# Altium footprint library ref-packages.PCBLIB: 1543 footprints (part 65 of 103)
Each footprint in its own frame and in the unit in brackets; x right, y up, seen from the top. Pads: shape width x height; smd on the part's side, far side on the other; paste and mask are expansions set on the pad; w line width, h text height; cw(c..) or ccw(c..) is an arc to the next point about the centre after c.
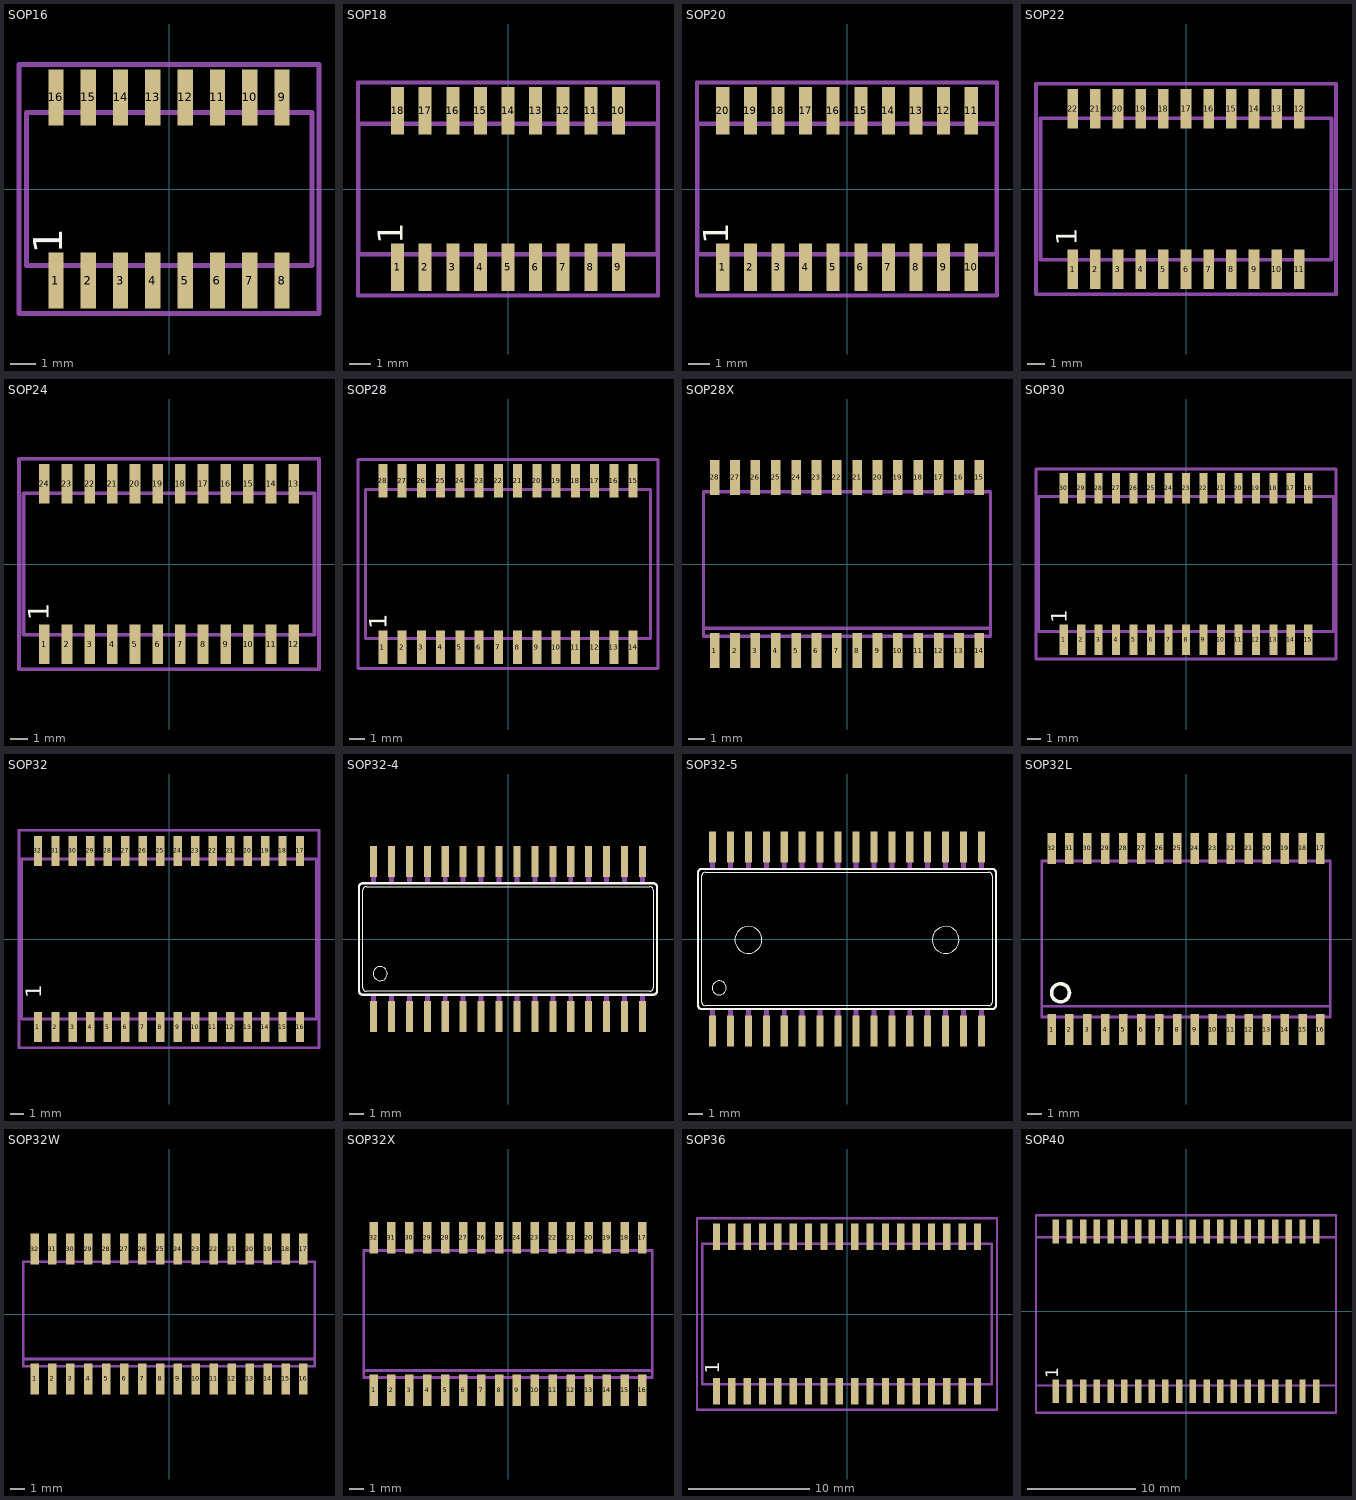
[diagram p64: the footprints below, top view; thin cyan lines are the x and y axes]

## SOP16 [mil]
pads (16):
  rect 23.62x86.61 smd: 1(-175,-141.73) 2(-125,-141.73) 3(-75,-141.73) 4(-25,-141.73) 5(25,-141.73) 6(75,-141.73) 7(125,-141.73) 8(175,-141.73) 9(175,141.73) 10(125,141.73) 11(75,141.73) 12(25,141.73) 13(-25,141.73) 14(-75,141.73) 15(-125,141.73) 16(-175,141.73)
Top Overlay:
  text "1" at -150,-100 h77.5
Mechanical 16:
  rectangle: -184.84,-174.8 -165.16,-122.44
  rectangle: -134.84,-174.8 -115.16,-122.44
  rectangle: -84.84,-174.8 -65.16,-122.44
  rectangle: -34.84,-174.8 -15.16,-122.44
  rectangle: 15.16,-174.8 34.84,-122.44
  rectangle: 65.16,-174.8 84.84,-122.44
  rectangle: 115.16,-174.8 134.84,-122.44
  rectangle: 165.16,-174.8 184.84,-122.44
  rectangle: 165.16,122.44 184.84,174.8
  rectangle: 115.16,122.44 134.84,174.8
  rectangle: 65.16,122.44 84.84,174.8
  rectangle: 15.16,122.44 34.84,174.8
  rectangle: -34.84,122.44 -15.16,174.8
  rectangle: -84.84,122.44 -65.16,174.8
  rectangle: -134.84,122.44 -115.16,174.8
  rectangle: -184.84,122.44 -165.16,174.8
  lines w8: -220.67,-118.5 -220.67,118.5 221.46,118.5 221.46,-118.5 -220.67,-118.5
Mechanical 27:
  lines w7.87: -232.28,-192.91 -232.28,192.91 232.28,192.91 232.28,-192.91 -232.28,-192.91

## SOP18 [mil]
pads (18):
  rect 23.62x86.61 smd: 1(-200,-141.73) 2(-150,-141.73) 3(-100,-141.73) 4(-50,-141.73) 5(0,-141.73) 6(50,-141.73) 7(100,-141.73) 8(150,-141.73) 9(200,-141.73) 10(200,141.73) 11(150,141.73) 12(100,141.73) 13(50,141.73) 14(0,141.73) 15(-50,141.73) 16(-100,141.73) 17(-150,141.73) 18(-200,141.73)
Top Overlay:
  text "1" at -175,-100 h77.5
Mechanical 16:
  rectangle: -209.84,-174.8 -190.16,-122.44
  rectangle: -159.84,-174.8 -140.16,-122.44
  rectangle: -109.84,-174.8 -90.16,-122.44
  rectangle: -59.84,-174.8 -40.16,-122.44
  rectangle: -9.84,-174.8 9.84,-122.44
  rectangle: 40.16,-174.8 59.84,-122.44
  rectangle: 90.16,-174.8 109.84,-122.44
  rectangle: 140.16,-174.8 159.84,-122.44
  rectangle: 190.16,-174.8 209.84,-122.44
  rectangle: 190.16,122.44 209.84,174.8
  rectangle: 140.16,122.44 159.84,174.8
  rectangle: 90.16,122.44 109.84,174.8
  rectangle: 40.16,122.44 59.84,174.8
  rectangle: -9.84,122.44 9.84,174.8
  rectangle: -59.84,122.44 -40.16,174.8
  rectangle: -109.84,122.44 -90.16,174.8
  rectangle: -159.84,122.44 -140.16,174.8
  rectangle: -209.84,122.44 -190.16,174.8
  lines w8: -270.87,-118.5 270.87,-118.5 270.87,118.5 -270.87,118.5 -270.87,-118.5
Mechanical 27:
  lines w7.87: -271.65,-192.91 -271.65,192.91 271.65,192.91 271.65,-192.91 -271.65,-192.91

## SOP20 [mil]
pads (20):
  rect 23.62x86.61 smd: 1(-225,-141.73) 2(-175,-141.73) 3(-125,-141.73) 4(-75,-141.73) 5(-25,-141.73) 6(25,-141.73) 7(75,-141.73) 8(125,-141.73) 9(175,-141.73) 10(225,-141.73) 11(225,141.73) 12(175,141.73) 13(125,141.73) 14(75,141.73) 15(25,141.73) 16(-25,141.73) 17(-75,141.73) 18(-125,141.73) 19(-175,141.73) 20(-225,141.73)
Top Overlay:
  text "1" at -200,-100 h77.5
Mechanical 16:
  rectangle: -234.84,-174.8 -215.16,-122.44
  rectangle: -184.84,-174.8 -165.16,-122.44
  rectangle: -134.84,-174.8 -115.16,-122.44
  rectangle: -84.84,-174.8 -65.16,-122.44
  rectangle: -34.84,-174.8 -15.16,-122.44
  rectangle: 15.16,-174.8 34.84,-122.44
  rectangle: 65.16,-174.8 84.84,-122.44
  rectangle: 115.16,-174.8 134.84,-122.44
  rectangle: 165.16,-174.8 184.84,-122.44
  rectangle: 215.16,-174.8 234.84,-122.44
  rectangle: 215.16,122.44 234.84,174.8
  rectangle: 165.16,122.44 184.84,174.8
  rectangle: 115.16,122.44 134.84,174.8
  rectangle: 65.16,122.44 84.84,174.8
  rectangle: 15.16,122.44 34.84,174.8
  rectangle: -34.84,122.44 -15.16,174.8
  rectangle: -84.84,122.44 -65.16,174.8
  rectangle: -134.84,122.44 -115.16,174.8
  rectangle: -184.84,122.44 -165.16,174.8
  rectangle: -234.84,122.44 -215.16,174.8
  lines w8: -270.87,-118.5 270.87,-118.5 270.87,118.5 -270.87,118.5 -270.87,-118.5
Mechanical 27:
  lines w7.87: -271.65,-192.91 -271.65,192.91 271.65,192.91 271.65,-192.91 -271.65,-192.91

## SOP22 [mil]
pads (22):
  rect 23.62x86.61 smd: 1(-250,-177.17) 2(-200,-177.17) 3(-150,-177.17) 4(-100,-177.17) 5(-50,-177.17) 6(0,-177.17) 7(50,-177.17) 8(100,-177.17) 9(150,-177.17) 10(200,-177.17) 11(250,-177.17) 12(250,177.17) 13(200,177.17) 14(150,177.17) 15(100,177.17) 16(50,177.17) 17(0,177.17) 18(-50,177.17) 19(-100,177.17) 20(-150,177.17) 21(-200,177.17) 22(-250,177.17)
Top Overlay:
  text "1" at -225,-125 h77.5
Mechanical 16:
  rectangle: -259.84,-212.2 -240.16,-159.84
  rectangle: -209.84,-212.2 -190.16,-159.84
  rectangle: -159.84,-212.2 -140.16,-159.84
  rectangle: -109.84,-212.2 -90.16,-159.84
  rectangle: -59.84,-212.2 -40.16,-159.84
  rectangle: -9.84,-212.2 9.84,-159.84
  rectangle: 40.16,-212.2 59.84,-159.84
  rectangle: 90.16,-212.2 109.84,-159.84
  rectangle: 140.16,-212.2 159.84,-159.84
  rectangle: 190.16,-212.2 209.84,-159.84
  rectangle: 240.16,-212.2 259.84,-159.84
  rectangle: 240.16,159.84 259.84,212.2
  rectangle: 190.16,159.84 209.84,212.2
  rectangle: 140.16,159.84 159.84,212.2
  rectangle: 90.16,159.84 109.84,212.2
  rectangle: 40.16,159.84 59.84,212.2
  rectangle: -9.84,159.84 9.84,212.2
  rectangle: -59.84,159.84 -40.16,212.2
  rectangle: -109.84,159.84 -90.16,212.2
  rectangle: -159.84,159.84 -140.16,212.2
  rectangle: -209.84,159.84 -190.16,212.2
  rectangle: -259.84,159.84 -240.16,212.2
  lines w8: -320.67,-155.91 320.67,-155.91 320.67,155.91 -320.67,155.91 -320.67,-155.91
Mechanical 27:
  lines w7.87: -330.71,-232.28 -330.71,232.28 330.71,232.28 330.71,-232.28 -330.71,-232.28

## SOP24 [mil]
pads (24):
  rect 23.62x86.61 smd: 1(-275,-177.17) 2(-225,-177.17) 3(-175,-177.17) 4(-125,-177.17) 5(-75,-177.17) 6(-25,-177.17) 7(25,-177.17) 8(75,-177.17) 9(125,-177.17) 10(175,-177.17) 11(225,-177.17) 12(275,-177.17) 13(275,177.17) 14(225,177.17) 15(175,177.17) 16(125,177.17) 17(75,177.17) 18(25,177.17) 19(-25,177.17) 20(-75,177.17) 21(-125,177.17) 22(-175,177.17) 23(-225,177.17) 24(-275,177.17)
Top Overlay:
  text "1" at -250,-125 h77.5
Mechanical 16:
  rectangle: -284.84,-212.2 -265.16,-159.84
  rectangle: -234.84,-212.2 -215.16,-159.84
  rectangle: -184.84,-212.2 -165.16,-159.84
  rectangle: -134.84,-212.2 -115.16,-159.84
  rectangle: -84.84,-212.2 -65.16,-159.84
  rectangle: -34.84,-212.2 -15.16,-159.84
  rectangle: 15.16,-212.2 34.84,-159.84
  rectangle: 65.16,-212.2 84.84,-159.84
  rectangle: 115.16,-212.2 134.84,-159.84
  rectangle: 165.16,-212.2 184.84,-159.84
  rectangle: 215.16,-212.2 234.84,-159.84
  rectangle: 265.16,-212.2 284.84,-159.84
  rectangle: 265.16,159.84 284.84,212.2
  rectangle: 215.16,159.84 234.84,212.2
  rectangle: 165.16,159.84 184.84,212.2
  rectangle: 115.16,159.84 134.84,212.2
  rectangle: 65.16,159.84 84.84,212.2
  rectangle: 15.16,159.84 34.84,212.2
  rectangle: -34.84,159.84 -15.16,212.2
  rectangle: -84.84,159.84 -65.16,212.2
  rectangle: -134.84,159.84 -115.16,212.2
  rectangle: -184.84,159.84 -165.16,212.2
  rectangle: -234.84,159.84 -215.16,212.2
  rectangle: -284.84,159.84 -265.16,212.2
  lines w8: -320.67,-155.91 320.67,-155.91 320.67,155.91 -320.67,155.91 -320.67,-155.91
Mechanical 27:
  lines w7.87: -330.71,-232.28 -330.71,232.28 330.71,232.28 330.71,-232.28 -330.71,-232.28

## SOP28 [mil]
pads (28):
  rect 23.62x86.61 smd: 1(-325,-216.54) 2(-275,-216.54) 3(-225,-216.54) 4(-175,-216.54) 5(-125,-216.54) 6(-75,-216.54) 7(-25,-216.54) 8(25,-216.54) 9(75,-216.54) 10(125,-216.54) 11(175,-216.54) 12(225,-216.54) 13(275,-216.54) 14(325,-216.54) 15(325,216.54) 16(275,216.54) 17(225,216.54) 18(175,216.54) 19(125,216.54) 20(75,216.54) 21(25,216.54) 22(-25,216.54) 23(-75,216.54) 24(-125,216.54) 25(-175,216.54) 26(-225,216.54) 27(-275,216.54) 28(-325,216.54)
Top Overlay:
  text "1" at -300,-169.69 h77.5
Mechanical 16:
  rectangle: -334.84,-249.61 -315.16,-197.24
  rectangle: -284.84,-249.61 -265.16,-197.24
  rectangle: -234.84,-249.61 -215.16,-197.24
  rectangle: -184.84,-249.61 -165.16,-197.24
  rectangle: -134.84,-249.61 -115.16,-197.24
  rectangle: -84.84,-249.61 -65.16,-197.24
  rectangle: -34.84,-249.61 -15.16,-197.24
  rectangle: 15.16,-249.61 34.84,-197.24
  rectangle: 65.16,-249.61 84.84,-197.24
  rectangle: 115.16,-249.61 134.84,-197.24
  rectangle: 165.16,-249.61 184.84,-197.24
  rectangle: 215.16,-249.61 234.84,-197.24
  rectangle: 265.16,-249.61 284.84,-197.24
  rectangle: 315.16,-249.61 334.84,-197.24
  rectangle: 315.16,197.24 334.84,249.61
  rectangle: 265.16,197.24 284.84,249.61
  rectangle: 215.16,197.24 234.84,249.61
  rectangle: 165.16,197.24 184.84,249.61
  rectangle: 115.16,197.24 134.84,249.61
  rectangle: 65.16,197.24 84.84,249.61
  rectangle: 15.16,197.24 34.84,249.61
  rectangle: -34.84,197.24 -15.16,249.61
  rectangle: -84.84,197.24 -65.16,249.61
  rectangle: -134.84,197.24 -115.16,249.61
  rectangle: -184.84,197.24 -165.16,249.61
  rectangle: -234.84,197.24 -215.16,249.61
  rectangle: -284.84,197.24 -265.16,249.61
  rectangle: -334.84,197.24 -315.16,249.61
  lines w8: -370.67,-193.31 370.67,-193.31 370.67,193.31 -370.67,193.31 -370.67,-193.31
Mechanical 27:
  lines w7.87: -389.76,-271.65 -389.76,271.65 389.76,271.65 389.76,-271.65 -389.76,-271.65

## SOP28X [mil]
pads (28):
  rect 23.62x86.61 smd: 1(-325,-212.6) 2(-275,-212.6) 3(-225,-212.6) 4(-175,-212.6) 5(-125,-212.6) 6(-75,-212.6) 7(-25,-212.6) 8(25,-212.6) 9(75,-212.6) 10(125,-212.6) 11(175,-212.6) 12(225,-212.6) 13(275,-212.6) 14(325,-212.6) 15(325,212.6) 16(275,212.6) 17(225,212.6) 18(175,212.6) 19(125,212.6) 20(75,212.6) 21(25,212.6) 22(-25,212.6) 23(-75,212.6) 24(-125,212.6) 25(-175,212.6) 26(-225,212.6) 27(-275,212.6) 28(-325,212.6)
Mechanical 16:
  rectangle: -334.65,-240.94 -315.35,-181.1
  rectangle: -284.65,-240.94 -265.35,-181.1
  rectangle: -234.65,-240.94 -215.35,-181.1
  rectangle: -184.65,-240.94 -165.35,-181.1
  rectangle: -134.65,-240.94 -115.35,-181.1
  rectangle: -84.65,-240.94 -65.35,-181.1
  rectangle: -34.65,-240.94 -15.35,-181.1
  rectangle: 15.35,-240.94 34.65,-181.1
  rectangle: 65.35,-240.94 84.65,-181.1
  rectangle: 115.35,-240.94 134.65,-181.1
  rectangle: 165.35,-240.94 184.65,-181.1
  rectangle: 215.35,-240.94 234.65,-181.1
  rectangle: 265.35,-240.94 284.65,-181.1
  rectangle: 315.35,-240.94 334.65,-181.1
  rectangle: 315.35,181.1 334.65,240.94
  rectangle: 265.35,181.1 284.65,240.94
  rectangle: 215.35,181.1 234.65,240.94
  rectangle: 165.35,181.1 184.65,240.94
  rectangle: 115.35,181.1 134.65,240.94
  rectangle: 65.35,181.1 84.65,240.94
  rectangle: 15.35,181.1 34.65,240.94
  rectangle: -34.65,181.1 -15.35,240.94
  rectangle: -84.65,181.1 -65.35,240.94
  rectangle: -134.65,181.1 -115.35,240.94
  rectangle: -184.65,181.1 -165.35,240.94
  rectangle: -234.65,181.1 -215.35,240.94
  rectangle: -284.65,181.1 -265.35,240.94
  rectangle: -334.65,181.1 -315.35,240.94
  lines w8: -352.36,-157.48 -352.36,-177.17 352.36,-177.17 352.36,-157.48 ; -352.36,-157.48 -352.36,177.17 352.36,177.17 352.36,-157.48 ; -352.36,-157.48 352.36,-157.48

## SOP30 [mil]
pads (30):
  rect 23.62x86.61 smd: 1(-350,-216.54) 2(-300,-216.54) 3(-250,-216.54) 4(-200,-216.54) 5(-150,-216.54) 6(-100,-216.54) 7(-50,-216.54) 8(0,-216.54) 9(50,-216.54) 10(100,-216.54) 11(150,-216.54) 12(200,-216.54) 13(250,-216.54) 14(300,-216.54) 15(350,-216.54) 16(350,216.54) 17(300,216.54) 18(250,216.54) 19(200,216.54) 20(150,216.54) 21(100,216.54) 22(50,216.54) 23(0,216.54) 24(-50,216.54) 25(-100,216.54) 26(-150,216.54) 27(-200,216.54) 28(-250,216.54) 29(-300,216.54) 30(-350,216.54)
Top Overlay:
  text "1" at -325,-169.69 h77.5
Mechanical 16:
  rectangle: -359.84,-249.61 -340.16,-197.24
  rectangle: -309.84,-249.61 -290.16,-197.24
  rectangle: -259.84,-249.61 -240.16,-197.24
  rectangle: -209.84,-249.61 -190.16,-197.24
  rectangle: -159.84,-249.61 -140.16,-197.24
  rectangle: -109.84,-249.61 -90.16,-197.24
  rectangle: -59.84,-249.61 -40.16,-197.24
  rectangle: -9.84,-249.61 9.84,-197.24
  rectangle: 40.16,-249.61 59.84,-197.24
  rectangle: 90.16,-249.61 109.84,-197.24
  rectangle: 140.16,-249.61 159.84,-197.24
  rectangle: 190.16,-249.61 209.84,-197.24
  rectangle: 240.16,-249.61 259.84,-197.24
  rectangle: 290.16,-249.61 309.84,-197.24
  rectangle: 340.16,-249.61 359.84,-197.24
  rectangle: 340.16,197.24 359.84,249.61
  rectangle: 290.16,197.24 309.84,249.61
  rectangle: 240.16,197.24 259.84,249.61
  rectangle: 190.16,197.24 209.84,249.61
  rectangle: 140.16,197.24 159.84,249.61
  rectangle: 90.16,197.24 109.84,249.61
  rectangle: 40.16,197.24 59.84,249.61
  rectangle: -9.84,197.24 9.84,249.61
  rectangle: -59.84,197.24 -40.16,249.61
  rectangle: -109.84,197.24 -90.16,249.61
  rectangle: -159.84,197.24 -140.16,249.61
  rectangle: -209.84,197.24 -190.16,249.61
  rectangle: -259.84,197.24 -240.16,249.61
  rectangle: -309.84,197.24 -290.16,249.61
  rectangle: -359.84,197.24 -340.16,249.61
  lines w8: -421.26,-193.31 421.26,-193.31 421.26,193.31 -421.26,193.31 -421.26,-193.31
Mechanical 27:
  lines w7.87: -429.13,-271.65 -429.13,271.65 429.13,271.65 429.13,-271.65 -429.13,-271.65

## SOP32 [mil]
pads (32):
  rect 23.62x86.61 smd: 1(-375,-251.97) 2(-325,-251.97) 3(-275,-251.97) 4(-225,-251.97) 5(-175,-251.97) 6(-125,-251.97) 7(-75,-251.97) 8(-25,-251.97) 9(25,-251.97) 10(75,-251.97) 11(125,-251.97) 12(175,-251.97) 13(225,-251.97) 14(275,-251.97) 15(325,-251.97) 16(375,-251.97) 17(375,251.97) 18(325,251.97) 19(275,251.97) 20(225,251.97) 21(175,251.97) 22(125,251.97) 23(75,251.97) 24(25,251.97) 25(-25,251.97) 26(-75,251.97) 27(-125,251.97) 28(-175,251.97) 29(-225,251.97) 30(-275,251.97) 31(-325,251.97) 32(-375,251.97)
Top Overlay:
  text "1" at -350,-169.69 h77.5
Mechanical 16:
  rectangle: -384.84,-285.04 -365.16,-232.68
  rectangle: -334.84,-285.04 -315.16,-232.68
  rectangle: -284.84,-285.04 -265.16,-232.68
  rectangle: -234.84,-285.04 -215.16,-232.68
  rectangle: -184.84,-285.04 -165.16,-232.68
  rectangle: -134.84,-285.04 -115.16,-232.68
  rectangle: -84.84,-285.04 -65.16,-232.68
  rectangle: -34.84,-285.04 -15.16,-232.68
  rectangle: 15.16,-285.04 34.84,-232.68
  rectangle: 65.16,-285.04 84.84,-232.68
  rectangle: 115.16,-285.04 134.84,-232.68
  rectangle: 165.16,-285.04 184.84,-232.68
  rectangle: 215.16,-285.04 234.84,-232.68
  rectangle: 265.16,-285.04 284.84,-232.68
  rectangle: 315.16,-285.04 334.84,-232.68
  rectangle: 365.16,-285.04 384.84,-232.68
  rectangle: 365.16,232.68 384.84,285.04
  rectangle: 315.16,232.68 334.84,285.04
  rectangle: 265.16,232.68 284.84,285.04
  rectangle: 215.16,232.68 234.84,285.04
  rectangle: 165.16,232.68 184.84,285.04
  rectangle: 115.16,232.68 134.84,285.04
  rectangle: 65.16,232.68 84.84,285.04
  rectangle: 15.16,232.68 34.84,285.04
  rectangle: -34.84,232.68 -15.16,285.04
  rectangle: -84.84,232.68 -65.16,285.04
  rectangle: -134.84,232.68 -115.16,285.04
  rectangle: -184.84,232.68 -165.16,285.04
  rectangle: -234.84,232.68 -215.16,285.04
  rectangle: -284.84,232.68 -265.16,285.04
  rectangle: -334.84,232.68 -315.16,285.04
  rectangle: -384.84,232.68 -365.16,285.04
  lines w8: -421.26,-228.74 421.26,-228.74 421.26,228.74 -421.26,228.74 -421.26,-228.74
Mechanical 27:
  lines w7.87: -429.13,-311.02 -429.13,311.02 429.13,311.02 429.13,-311.02 -429.13,-311.02

## SOP32-4 [mil]
pads (32):
  rect 19.69x86.61 smd: 1(-375,-216.54) 2(-325,-216.54) 3(-275,-216.54) 4(-225,-216.54) 5(-175,-216.54) 6(-125,-216.54) 7(-75,-216.54) 8(-25,-216.54) 9(25,-216.54) 10(75,-216.54) 11(125,-216.54) 12(175,-216.54) 13(225,-216.54) 14(275,-216.54) 15(325,-216.54) 16(375,-216.54) 17(375,216.54) 18(325,216.54) 19(275,216.54) 20(225,216.54) 21(175,216.54) 22(125,216.54) 23(75,216.54) 24(25,216.54) 25(-25,216.54) 26(-75,216.54) 27(-125,216.54) 28(-175,216.54) 29(-225,216.54) 30(-275,216.54) 31(-325,216.54) 32(-375,216.54)
Top Overlay:
  circle w2: c-356.1,-96.46 r19.69
  lines w2: -405.32,-135.83 -405.32,135.83 cw(c-395.48,135.82) -395.47,145.67 395.87,145.67 cw(c395.67,136.02) 405.32,136.22 405.32,-135.83 cw(c395.48,-135.82) 395.47,-145.67 -395.47,-145.67 cw(c-395.48,-135.82) -405.32,-135.83
  lines w6: -405.35,155.51 -405.32,155.51 ; -405.32,155.51 405.32,155.51 cw(c405.32,145.67) 415.16,145.67 415.16,-145.67 cw(c405.32,-145.67) 405.32,-155.51 -405.32,-155.51 cw(c-405.33,-145.67) -415.16,-146.06 -415.16,145.67 cw(c-405.32,145.67) -405.32,155.51
Mechanical 16:
  rectangle: -281.89,155.51 -268.11,236.22
  rectangle: -231.89,155.51 -218.11,236.22
  rectangle: -181.89,155.51 -168.11,236.22
  rectangle: -131.89,155.51 -118.11,236.22
  rectangle: -81.89,155.51 -68.11,236.22
  rectangle: -31.89,155.51 -18.11,236.22
  rectangle: 18.11,155.51 31.89,236.22
  rectangle: 68.11,155.51 81.89,236.22
  rectangle: 118.11,155.51 131.89,236.22
  rectangle: 168.11,155.51 181.89,236.22
  rectangle: 218.11,155.51 231.89,236.22
  rectangle: 268.11,155.51 281.89,236.22
  rectangle: -281.89,-236.22 -268.11,-155.51
  rectangle: -231.89,-236.22 -218.11,-155.51
  rectangle: -181.89,-236.22 -168.11,-155.51
  rectangle: -131.89,-236.22 -118.11,-155.51
  rectangle: -81.89,-236.22 -68.11,-155.51
  rectangle: -31.89,-236.22 -18.11,-155.51
  rectangle: 18.11,-236.22 31.89,-155.51
  rectangle: 68.11,-236.22 81.89,-155.51
  rectangle: 118.11,-236.22 131.89,-155.51
  rectangle: 168.11,-236.22 181.89,-155.51
  rectangle: 218.11,-236.22 231.89,-155.51
  rectangle: 268.11,-236.22 281.89,-155.51
  rectangle: 318.11,155.51 331.89,236.22
  rectangle: 368.11,155.51 381.89,236.22
  rectangle: 318.11,-236.22 331.89,-155.51
  rectangle: 368.11,-236.22 381.89,-155.51
  rectangle: -381.89,155.51 -368.11,236.22
  rectangle: -331.89,155.51 -318.11,236.22
  rectangle: -381.89,-236.22 -368.11,-155.51
  rectangle: -331.89,-236.22 -318.11,-155.51

## SOP32-5 [mil]
pads (32):
  rect 19.69x86.61 smd: 1(-375,-256.54) 2(-325,-256.54) 3(-275,-256.54) 4(-225,-256.54) 5(-175,-256.54) 6(-125,-256.54) 7(-75,-256.54) 8(-25,-256.54) 9(25,-256.54) 10(75,-256.54) 11(125,-256.54) 12(175,-256.54) 13(225,-256.54) 14(275,-256.54) 15(325,-256.54) 16(375,-256.54) 17(375,256.54) 18(325,256.54) 19(275,256.54) 20(225,256.54) 21(175,256.54) 22(125,256.54) 23(75,256.54) 24(25,256.54) 25(-25,256.54) 26(-75,256.54) 27(-125,256.54) 28(-175,256.54) 29(-225,256.54) 30(-275,256.54) 31(-325,256.54) 32(-375,256.54)
Top Overlay:
  circle w2: c-356.1,-136.46 r19.69
  circle w2: c-275,-2.5 r37.5
  circle w2: c275,-2.5 r37.5
  lines w2: -405.32,-175.83 -405.32,175.83 cw(c-395.48,175.82) -395.47,185.67 395.87,185.67 cw(c395.67,176.02) 405.32,176.22 405.32,-175.83 cw(c395.48,-175.82) 395.47,-185.67 -395.47,-185.67 cw(c-395.48,-175.82) -405.32,-175.83
  lines w6: -405.35,195.51 -405.32,195.51 ; -405.32,195.51 405.32,195.51 cw(c405.32,185.67) 415.16,185.67 415.16,-185.67 cw(c405.32,-185.67) 405.32,-195.51 -405.32,-195.51 cw(c-405.33,-185.67) -415.16,-186.06 -415.16,185.67 cw(c-405.32,185.67) -405.32,195.51
Mechanical 16:
  rectangle: -281.89,195.51 -268.11,276.22
  rectangle: -231.89,195.51 -218.11,276.22
  rectangle: -181.89,195.51 -168.11,276.22
  rectangle: -131.89,195.51 -118.11,276.22
  rectangle: -81.89,195.51 -68.11,276.22
  rectangle: -31.89,195.51 -18.11,276.22
  rectangle: 18.11,195.51 31.89,276.22
  rectangle: 68.11,195.51 81.89,276.22
  rectangle: 118.11,195.51 131.89,276.22
  rectangle: 168.11,195.51 181.89,276.22
  rectangle: 218.11,195.51 231.89,276.22
  rectangle: 268.11,195.51 281.89,276.22
  rectangle: -281.89,-276.22 -268.11,-195.51
  rectangle: -231.89,-276.22 -218.11,-195.51
  rectangle: -181.89,-276.22 -168.11,-195.51
  rectangle: -131.89,-276.22 -118.11,-195.51
  rectangle: -81.89,-276.22 -68.11,-195.51
  rectangle: -31.89,-276.22 -18.11,-195.51
  rectangle: 18.11,-276.22 31.89,-195.51
  rectangle: 68.11,-276.22 81.89,-195.51
  rectangle: 118.11,-276.22 131.89,-195.51
  rectangle: 168.11,-276.22 181.89,-195.51
  rectangle: 218.11,-276.22 231.89,-195.51
  rectangle: 268.11,-276.22 281.89,-195.51
  rectangle: 318.11,195.51 331.89,276.22
  rectangle: 368.11,195.51 381.89,276.22
  rectangle: 318.11,-276.22 331.89,-195.51
  rectangle: 368.11,-276.22 381.89,-195.51
  rectangle: -381.89,195.51 -368.11,276.22
  rectangle: -331.89,195.51 -318.11,276.22
  rectangle: -381.89,-276.22 -368.11,-195.51
  rectangle: -331.89,-276.22 -318.11,-195.51

## SOP32L [mil]
pads (32):
  rect 23.62x86.61 smd: 1(-375,-252.6) 2(-325,-252.6) 3(-275,-252.6) 4(-225,-252.6) 5(-175,-252.6) 6(-125,-252.6) 7(-75,-252.6) 8(-25,-252.6) 9(25,-252.6) 10(75,-252.6) 11(125,-252.6) 12(175,-252.6) 13(225,-252.6) 14(275,-252.6) 15(325,-252.6) 16(375,-252.6) 17(375,252.6) 18(325,252.6) 19(275,252.6) 20(225,252.6) 21(175,252.6) 22(125,252.6) 23(75,252.6) 24(25,252.6) 25(-25,252.6) 26(-75,252.6) 27(-125,252.6) 28(-175,252.6) 29(-225,252.6) 30(-275,252.6) 31(-325,252.6) 32(-375,252.6)
Top Overlay:
  circle w10: c-350,-150 r25
Mechanical 16:
  rectangle: -384.65,-280.94 -365.35,-221.1
  rectangle: -334.65,-280.94 -315.35,-221.1
  rectangle: -284.65,-280.94 -265.35,-221.1
  rectangle: -234.65,-280.94 -215.35,-221.1
  rectangle: -184.65,-280.94 -165.35,-221.1
  rectangle: -134.65,-280.94 -115.35,-221.1
  rectangle: -84.65,-280.94 -65.35,-221.1
  rectangle: -34.65,-280.94 -15.35,-221.1
  rectangle: 15.35,-280.94 34.65,-221.1
  rectangle: 65.35,-280.94 84.65,-221.1
  rectangle: 115.35,-280.94 134.65,-221.1
  rectangle: 165.35,-280.94 184.65,-221.1
  rectangle: 215.35,-280.94 234.65,-221.1
  rectangle: 265.35,-280.94 284.65,-221.1
  rectangle: 315.35,-280.94 334.65,-221.1
  rectangle: 365.35,-280.94 384.65,-221.1
  rectangle: 365.35,221.1 384.65,280.94
  rectangle: 315.35,221.1 334.65,280.94
  rectangle: 265.35,221.1 284.65,280.94
  rectangle: 215.35,221.1 234.65,280.94
  rectangle: 165.35,221.1 184.65,280.94
  rectangle: 115.35,221.1 134.65,280.94
  rectangle: 65.35,221.1 84.65,280.94
  rectangle: 15.35,221.1 34.65,280.94
  rectangle: -34.65,221.1 -15.35,280.94
  rectangle: -84.65,221.1 -65.35,280.94
  rectangle: -134.65,221.1 -115.35,280.94
  rectangle: -184.65,221.1 -165.35,280.94
  rectangle: -234.65,221.1 -215.35,280.94
  rectangle: -284.65,221.1 -265.35,280.94
  rectangle: -334.65,221.1 -315.35,280.94
  rectangle: -384.65,221.1 -365.35,280.94
  lines w8: -402.36,-187.48 -402.36,-217.17 402.36,-217.17 402.36,-187.48 ; -402.36,-187.48 -402.36,217.17 402.36,217.17 402.36,-187.48 ; -402.36,-187.48 402.36,-187.48

## SOP32W [mil]
pads (32):
  rect 23.62x86.61 smd: 1(-375,-181.1) 2(-325,-181.1) 3(-275,-181.1) 4(-225,-181.1) 5(-175,-181.1) 6(-125,-181.1) 7(-75,-181.1) 8(-25,-181.1) 9(25,-181.1) 10(75,-181.1) 11(125,-181.1) 12(175,-181.1) 13(225,-181.1) 14(275,-181.1) 15(325,-181.1) 16(375,-181.1) 17(375,181.1) 18(325,181.1) 19(275,181.1) 20(225,181.1) 21(175,181.1) 22(125,181.1) 23(75,181.1) 24(25,181.1) 25(-25,181.1) 26(-75,181.1) 27(-125,181.1) 28(-175,181.1) 29(-225,181.1) 30(-275,181.1) 31(-325,181.1) 32(-375,181.1)
Mechanical 16:
  rectangle: -384.65,-209.45 -365.35,-149.61
  rectangle: -334.65,-209.45 -315.35,-149.61
  rectangle: -284.65,-209.45 -265.35,-149.61
  rectangle: -234.65,-209.45 -215.35,-149.61
  rectangle: -184.65,-209.45 -165.35,-149.61
  rectangle: -134.65,-209.45 -115.35,-149.61
  rectangle: -84.65,-209.45 -65.35,-149.61
  rectangle: -34.65,-209.45 -15.35,-149.61
  rectangle: 15.35,-209.45 34.65,-149.61
  rectangle: 65.35,-209.45 84.65,-149.61
  rectangle: 115.35,-209.45 134.65,-149.61
  rectangle: 165.35,-209.45 184.65,-149.61
  rectangle: 215.35,-209.45 234.65,-149.61
  rectangle: 265.35,-209.45 284.65,-149.61
  rectangle: 315.35,-209.45 334.65,-149.61
  rectangle: 365.35,-209.45 384.65,-149.61
  rectangle: 365.35,149.61 384.65,209.45
  rectangle: 315.35,149.61 334.65,209.45
  rectangle: 265.35,149.61 284.65,209.45
  rectangle: 215.35,149.61 234.65,209.45
  rectangle: 165.35,149.61 184.65,209.45
  rectangle: 115.35,149.61 134.65,209.45
  rectangle: 65.35,149.61 84.65,209.45
  rectangle: 15.35,149.61 34.65,209.45
  rectangle: -34.65,149.61 -15.35,209.45
  rectangle: -84.65,149.61 -65.35,209.45
  rectangle: -134.65,149.61 -115.35,209.45
  rectangle: -184.65,149.61 -165.35,209.45
  rectangle: -234.65,149.61 -215.35,209.45
  rectangle: -284.65,149.61 -265.35,209.45
  rectangle: -334.65,149.61 -315.35,209.45
  rectangle: -384.65,149.61 -365.35,209.45
  lines w8: -406.3,-125.98 -406.3,-145.67 406.3,-145.67 406.3,-125.98 ; -406.3,-125.98 -406.3,145.67 406.3,145.67 406.3,-125.98 ; -406.3,-125.98 406.3,-125.98

## SOP32X [mil]
pads (32):
  rect 23.62x86.61 smd: 1(-375,-212.6) 2(-325,-212.6) 3(-275,-212.6) 4(-225,-212.6) 5(-175,-212.6) 6(-125,-212.6) 7(-75,-212.6) 8(-25,-212.6) 9(25,-212.6) 10(75,-212.6) 11(125,-212.6) 12(175,-212.6) 13(225,-212.6) 14(275,-212.6) 15(325,-212.6) 16(375,-212.6) 17(375,212.6) 18(325,212.6) 19(275,212.6) 20(225,212.6) 21(175,212.6) 22(125,212.6) 23(75,212.6) 24(25,212.6) 25(-25,212.6) 26(-75,212.6) 27(-125,212.6) 28(-175,212.6) 29(-225,212.6) 30(-275,212.6) 31(-325,212.6) 32(-375,212.6)
Mechanical 16:
  rectangle: -384.65,-240.94 -365.35,-181.1
  rectangle: -334.65,-240.94 -315.35,-181.1
  rectangle: -284.65,-240.94 -265.35,-181.1
  rectangle: -234.65,-240.94 -215.35,-181.1
  rectangle: -184.65,-240.94 -165.35,-181.1
  rectangle: -134.65,-240.94 -115.35,-181.1
  rectangle: -84.65,-240.94 -65.35,-181.1
  rectangle: -34.65,-240.94 -15.35,-181.1
  rectangle: 15.35,-240.94 34.65,-181.1
  rectangle: 65.35,-240.94 84.65,-181.1
  rectangle: 115.35,-240.94 134.65,-181.1
  rectangle: 165.35,-240.94 184.65,-181.1
  rectangle: 215.35,-240.94 234.65,-181.1
  rectangle: 265.35,-240.94 284.65,-181.1
  rectangle: 315.35,-240.94 334.65,-181.1
  rectangle: 365.35,-240.94 384.65,-181.1
  rectangle: 365.35,181.1 384.65,240.94
  rectangle: 315.35,181.1 334.65,240.94
  rectangle: 265.35,181.1 284.65,240.94
  rectangle: 215.35,181.1 234.65,240.94
  rectangle: 165.35,181.1 184.65,240.94
  rectangle: 115.35,181.1 134.65,240.94
  rectangle: 65.35,181.1 84.65,240.94
  rectangle: 15.35,181.1 34.65,240.94
  rectangle: -34.65,181.1 -15.35,240.94
  rectangle: -84.65,181.1 -65.35,240.94
  rectangle: -134.65,181.1 -115.35,240.94
  rectangle: -184.65,181.1 -165.35,240.94
  rectangle: -234.65,181.1 -215.35,240.94
  rectangle: -284.65,181.1 -265.35,240.94
  rectangle: -334.65,181.1 -315.35,240.94
  rectangle: -384.65,181.1 -365.35,240.94
  lines w8: -402.36,-157.48 -402.36,-177.17 402.36,-177.17 402.36,-157.48 ; -402.36,-157.48 -402.36,177.17 402.36,177.17 402.36,-157.48 ; -402.36,-157.48 402.36,-157.48

## SOP36 [mil]
pads (36):
  rect 23.62x86.61 smd: 1(-425,-251.97) 2(-375,-251.97) 3(-325,-251.97) 4(-275,-251.97) 5(-225,-251.97) 6(-175,-251.97) 7(-125,-251.97) 8(-75,-251.97) 9(-25,-251.97) 10(25,-251.97) 11(75,-251.97) 12(125,-251.97) 13(175,-251.97) 14(225,-251.97) 15(275,-251.97) 16(325,-251.97) 17(375,-251.97) 18(425,-251.97) 19(425,251.97) 20(375,251.97) 21(325,251.97) 22(275,251.97) 23(225,251.97) 24(175,251.97) 25(125,251.97) 26(75,251.97) 27(25,251.97) 28(-25,251.97) 29(-75,251.97) 30(-125,251.97) 31(-175,251.97) 32(-225,251.97) 33(-275,251.97) 34(-325,251.97) 35(-375,251.97) 36(-425,251.97)
Top Overlay:
  text "1" at -400,-194.69 h77.5
Mechanical 16:
  rectangle: -434.84,-285.04 -415.16,-232.68
  rectangle: -384.84,-285.04 -365.16,-232.68
  rectangle: -334.84,-285.04 -315.16,-232.68
  rectangle: -284.84,-285.04 -265.16,-232.68
  rectangle: -234.84,-285.04 -215.16,-232.68
  rectangle: -184.84,-285.04 -165.16,-232.68
  rectangle: -134.84,-285.04 -115.16,-232.68
  rectangle: -84.84,-285.04 -65.16,-232.68
  rectangle: -34.84,-285.04 -15.16,-232.68
  rectangle: 15.16,-285.04 34.84,-232.68
  rectangle: 65.16,-285.04 84.84,-232.68
  rectangle: 115.16,-285.04 134.84,-232.68
  rectangle: 165.16,-285.04 184.84,-232.68
  rectangle: 215.16,-285.04 234.84,-232.68
  rectangle: 265.16,-285.04 284.84,-232.68
  rectangle: 315.16,-285.04 334.84,-232.68
  rectangle: 365.16,-285.04 384.84,-232.68
  rectangle: 415.16,-285.04 434.84,-232.68
  rectangle: 415.16,232.68 434.84,285.04
  rectangle: 365.16,232.68 384.84,285.04
  rectangle: 315.16,232.68 334.84,285.04
  rectangle: 265.16,232.68 284.84,285.04
  rectangle: 215.16,232.68 234.84,285.04
  rectangle: 165.16,232.68 184.84,285.04
  rectangle: 115.16,232.68 134.84,285.04
  rectangle: 65.16,232.68 84.84,285.04
  rectangle: 15.16,232.68 34.84,285.04
  rectangle: -34.84,232.68 -15.16,285.04
  rectangle: -84.84,232.68 -65.16,285.04
  rectangle: -134.84,232.68 -115.16,285.04
  rectangle: -184.84,232.68 -165.16,285.04
  rectangle: -234.84,232.68 -215.16,285.04
  rectangle: -284.84,232.68 -265.16,285.04
  rectangle: -334.84,232.68 -315.16,285.04
  rectangle: -384.84,232.68 -365.16,285.04
  rectangle: -434.84,232.68 -415.16,285.04
  lines w8: -471.26,-228.74 471.26,-228.74 471.26,228.74 -471.26,228.74 -471.26,-228.74
Mechanical 27:
  lines w7.87: -488.19,-311.02 -488.19,311.02 488.19,311.02 488.19,-311.02 -488.19,-311.02

## SOP40 [mil]
pads (40):
  rect 23.62x86.61 smd: 1(-475,-291.34) 2(-425,-291.34) 3(-375,-291.34) 4(-325,-291.34) 5(-275,-291.34) 6(-225,-291.34) 7(-175,-291.34) 8(-125,-291.34) 9(-75,-291.34) 10(-25,-291.34) 11(25,-291.34) 12(75,-291.34) 13(125,-291.34) 14(175,-291.34) 15(225,-291.34) 16(275,-291.34) 17(325,-291.34) 18(375,-291.34) 19(425,-291.34) 20(475,-291.34) 21(475,291.34) 22(425,291.34) 23(375,291.34) 24(325,291.34) 25(275,291.34) 26(225,291.34) 27(175,291.34) 28(125,291.34) 29(75,291.34) 30(25,291.34) 31(-25,291.34) 32(-75,291.34) 33(-125,291.34) 34(-175,291.34) 35(-225,291.34) 36(-275,291.34) 37(-325,291.34) 38(-375,291.34) 39(-425,291.34) 40(-475,291.34)
Top Overlay:
  text "1" at -450,-244.69 h77.5
Mechanical 16:
  rectangle: -484.65,-324.8 -465.35,-274.41
  rectangle: -434.65,-324.8 -415.35,-274.41
  rectangle: -384.65,-324.8 -365.35,-274.41
  rectangle: -334.65,-324.8 -315.35,-274.41
  rectangle: -284.65,-324.8 -265.35,-274.41
  rectangle: -234.65,-324.8 -215.35,-274.41
  rectangle: -184.65,-324.8 -165.35,-274.41
  rectangle: -134.65,-324.8 -115.35,-274.41
  rectangle: -84.65,-324.8 -65.35,-274.41
  rectangle: -34.65,-324.8 -15.35,-274.41
  rectangle: 15.35,-324.8 34.65,-274.41
  rectangle: 65.35,-324.8 84.65,-274.41
  rectangle: 115.35,-324.8 134.65,-274.41
  rectangle: 165.35,-324.8 184.65,-274.41
  rectangle: 215.35,-324.8 234.65,-274.41
  rectangle: 265.35,-324.8 284.65,-274.41
  rectangle: 315.35,-324.8 334.65,-274.41
  rectangle: 365.35,-324.8 384.65,-274.41
  rectangle: 415.35,-324.8 434.65,-274.41
  rectangle: 465.35,-324.8 484.65,-274.41
  rectangle: 465.35,274.41 484.65,324.8
  rectangle: 415.35,274.41 434.65,324.8
  rectangle: 365.35,274.41 384.65,324.8
  rectangle: 315.35,274.41 334.65,324.8
  rectangle: 265.35,274.41 284.65,324.8
  rectangle: 215.35,274.41 234.65,324.8
  rectangle: 165.35,274.41 184.65,324.8
  rectangle: 115.35,274.41 134.65,324.8
  rectangle: 65.35,274.41 84.65,324.8
  rectangle: 15.35,274.41 34.65,324.8
  rectangle: -34.65,274.41 -15.35,324.8
  rectangle: -84.65,274.41 -65.35,324.8
  rectangle: -134.65,274.41 -115.35,324.8
  rectangle: -184.65,274.41 -165.35,324.8
  rectangle: -234.65,274.41 -215.35,324.8
  rectangle: -284.65,274.41 -265.35,324.8
  rectangle: -334.65,274.41 -315.35,324.8
  rectangle: -384.65,274.41 -365.35,324.8
  rectangle: -434.65,274.41 -415.35,324.8
  rectangle: -484.65,274.41 -465.35,324.8
  lines w8: -547.24,-270.47 547.24,-270.47 547.24,270.47 -547.24,270.47 -547.24,-270.47
Mechanical 27:
  lines w7.87: -547.24,-370.08 -547.24,350.39 547.24,350.39 547.24,-370.08 -547.24,-370.08